# Altium footprint library SMPS1.PcbLib: 25 footprints (part 2 of 2)
Each footprint in its own frame and in the unit in brackets; x right, y up, seen from the top. Pads: shape width x height; smd on the part's side, far side on the other; paste and mask are expansions set on the pad; w line width, h text height; cw(c..) or ccw(c..) is an arc to the next point about the centre after c.
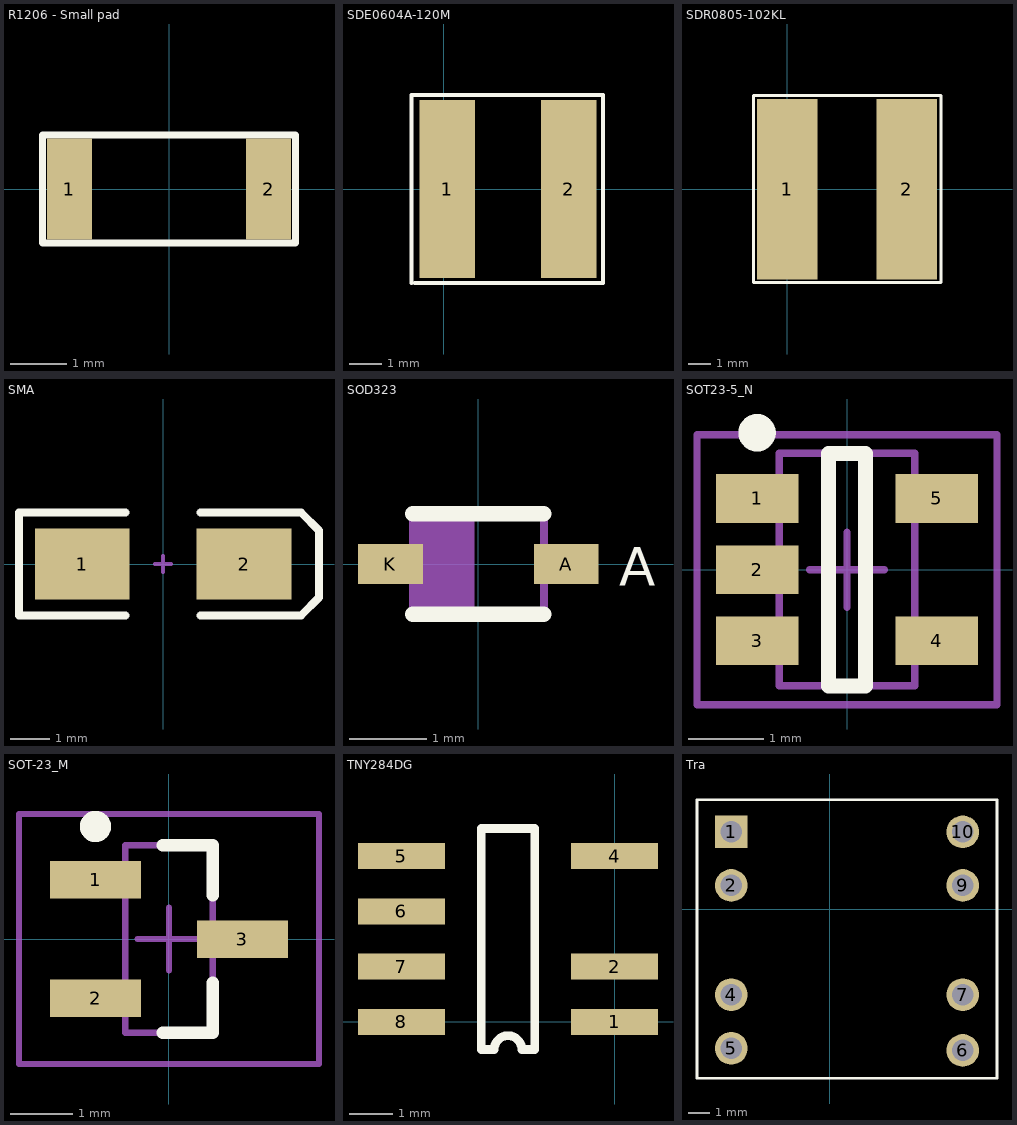
[diagram p1: the footprints below, top view; thin cyan lines are the x and y axes]

## R1206 - Small pad [mm]
pads (2):
  rect 0.8x1.8 smd: 1(-1.778,0) 2(1.778,0)
Top Overlay:
  lines w0.127: -2.261,-0.965 -1.346,-0.965 2.261,-0.965 2.261,0.965 -2.261,0.965 -2.261,-0.965
3D body: height 1, standoff 0, extent -1.6,-0.8 1.6,0.8

## SDE0604A-120M [mm]
pads (2):
  rect 1.7x5.5 smd: 1(0.1,0) 2(3.85,0)
Top Overlay:
  lines w0.127: -1,-2.9 -1,2.8 -1,2.9 4.9,2.9 4.9,-2.9 -0.9,-2.9
3D body: height 4.7, standoff 0.2, extent -0.885,-2.66 4.695,2.54

## SDR0805-102KL [mm]
pads (2):
  rect 2.7x8 smd: 1(0,0) 2(5.3,0)
Top Overlay:
  lines w0.127: -1.5,-4.14 -1.5,4.15 6.81,4.15 6.81,-4.14 -1.5,-4.14
3D body: height 5.3, standoff 0, extent -0.852,-3.9 6.948,3.9

## SMA [mm]
pads (2):
  rect 2.4x1.8 smd: 1(-2.05,0) 2(2.05,0)
Top Overlay:
  lines w0.2: -0.95,-1.3 -3.65,-1.3 -3.65,1.3 -0.95,1.3 ; 0.95,-1.3 3.5,-1.3 3.95,-0.85 3.95,0.85 3.5,1.3 0.95,1.3
Mechanical 1:
  lines w0.1: -0.2,0 0.2,0 ; 0,-0.2 0,0.2

## SOD323 [mm]
pads (2):
  rect 0.84x0.52 smd: A(1.14,0) K(-1.14,0)
Top Overlay:
  lines w0.2: -0.85,-0.65 0.85,-0.65 ; -0.85,0.65 0.85,0.65
  text "A" at 1.829,-0.279 h0.5
Mechanical 15:
  region: -0.85,-0.625 -0.05,-0.625 -0.05,0.625 -0.85,0.625
  lines w0.1: -0.85,-0.625 0.85,-0.625 0.85,0.625 -0.85,0.625 -0.85,-0.625
  text "1" at 0.45,-0.164 h0.75
3D body: height 0.79, standoff -0.08, extent -1.375,-0.664 1.325,0.686

## SOT23-5_N [mm] "SOT23, 5-Leads, Body 2.9x1.6mm, Pitch 0.95mm, Lead Span 2.8mm, IPC Medium Density"
height 1.45
pads (5):
  rect 1.1x0.65 smd: 1(-1.2,0.95) 2(-1.2,0) 3(-1.2,-0.95) 4(1.2,-0.95) 5(1.2,0.95)
Top Overlay:
  circle w0.25: c-1.2,1.825 r0.125
  lines w0.2: -0.25,-1.55 0.25,-1.55 0.25,1.55 -0.25,1.55 -0.25,-1.55
Mechanical 13:
  lines w0.1: -0.9,-1.55 -0.9,1.55 0.9,1.55 0.9,-1.55 -0.9,-1.55
Mechanical 15:
  lines w0.1: -0.5,0 0.5,0 ; 0,-0.5 0,0.5 ; -2,-1.8 -2,1.8 2,1.8 2,-1.8 -2,-1.8
3D body: height 1.45, standoff 0, extent -0.9,-1.55 0.9,1.55

## SOT-23_M [mm] "SOT23, 3-Leads, Body 2.9x1.3mm, Pitch 0.95mm, Lead Span 2.5mm, IPC Low Density"
height 1.1
pads (3):
  rect 1.45x0.6 smd: 1(-1.175,0.95) 2(-1.175,-0.95) 3(1.175,0)
Top Overlay:
  circle w0.25: c-1.175,1.8 r0.125
  lines w0.2: -0.1,-1.5 0.7,-1.5 0.7,-0.7 ; -0.1,1.5 0.7,1.5 0.7,0.7
Mechanical 13:
  lines w0.1: -0.7,-1.5 0.7,-1.5 0.7,1.5 -0.7,1.5 -0.7,-1.5
Mechanical 15:
  lines w0.1: -0.5,0 0.5,0 ; 0,-0.5 0,0.5 ; -2.4,-2 2.4,-2 2.4,2 -2.4,2 -2.4,-2
3D body: height 1.1, standoff 0, extent -0.7,-1.5 0.7,1.5

## TNY284DG [mm]
pads (7):
  rect 2x0.6 smd: 1(0,0) 2(0,1.27) 4(0,3.81) 5(-4.9,3.81) 6(-4.9,2.54) 7(-4.9,1.27) 8(-4.9,0)
Top Overlay:
  lines w0.2: -3.065,-0.635 -3.065,4.445 -1.835,4.445 -1.835,-0.635 -2.133,-0.635 ccw(c-2.45,-0.635) -2.768,-0.635 -3.065,-0.635
3D body: height -0.4, standoff -2.15, extent -5.54,-0.545 0.46,4.355

## Tra [mm]
pads (8):
  rect 1.524x1.524 hole 1: 1(-4.6,3.6)
  round 1.524 hole 1: 2(-4.6,1.1) 4(-4.6,-4) 5(-4.6,-6.5) 6(6.2,-6.6) 7(6.2,-4) 9(6.2,1.1) 10(6.2,3.6)
Top Overlay:
  lines w0.127: -6.2,-7.9 -6.2,5.1 7.8,5.1 7.8,-7.9 -6.2,-7.9
3D body: height 11.88, standoff -4.67, extent -5.3,-7.91 7.1,5.31